# Altium footprint library SMD_Bauteile.PcbLib: 355 footprints (part 20 of 23)
Each footprint in its own frame and in the unit in brackets; x right, y up, seen from the top. Pads: shape width x height; smd on the part's side, far side on the other; paste and mask are expansions set on the pad; w line width, h text height; cw(c..) or ccw(c..) is an arc to the next point about the centre after c.
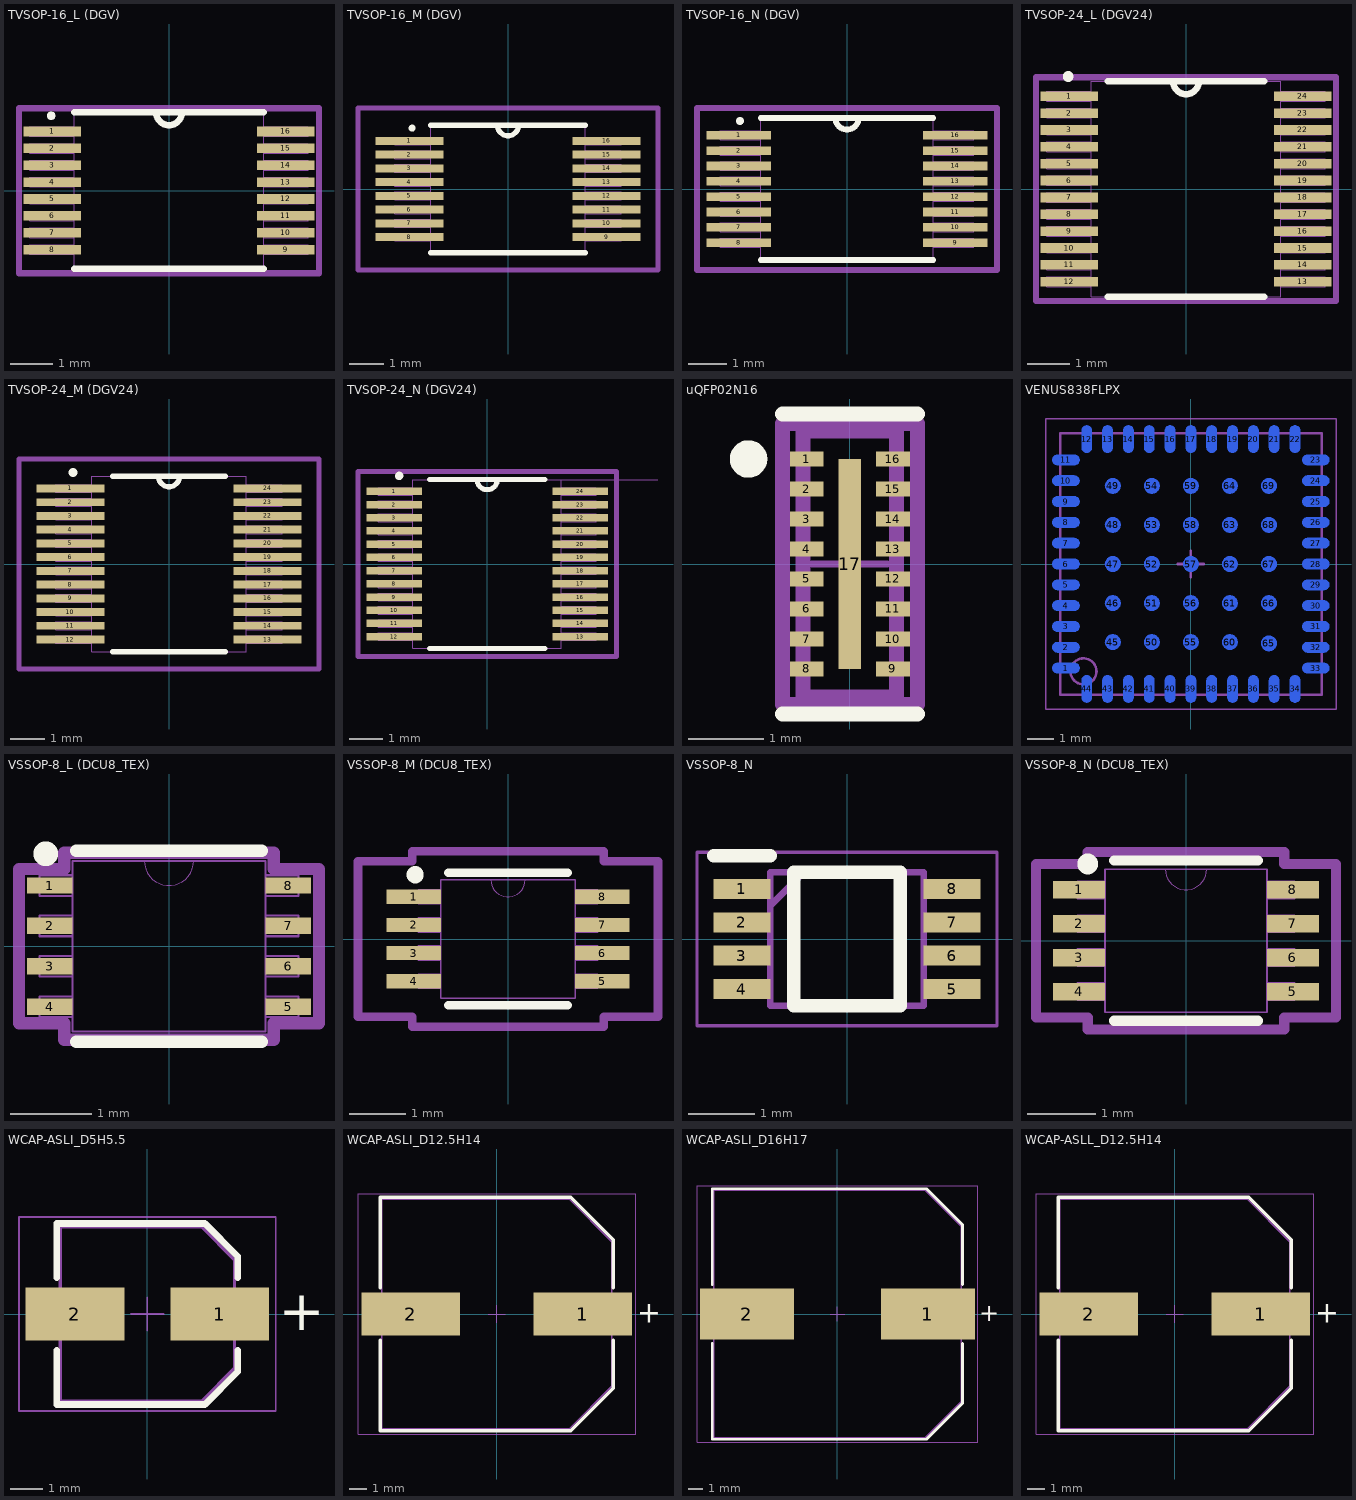
[diagram p19: the footprints below, top view; thin cyan lines are the x and y axes]

## TVSOP-16_L (DGV) [mil]
height 47.24
pads (16):
  rect 54x9 smd: 1(-109,55.12) 2(-109,39.37) 3(-109,23.62) 4(-109,7.87) 5(-109,-7.87) 6(-109,-23.62) 7(-109,-39.37) 8(-109,-55.12) 9(109,-55.12) 10(109,-39.37) 11(109,-23.62) 12(109,-7.87) 13(109,7.87) 14(109,23.62) 15(109,39.37) 16(109,55.12)
Top Overlay:
  circle w7.87: c-110,69.83 r0.1
  lines w6: -88.5,-73 88.5,-73 ; -88.5,73 88.5,73 ; -12,73 ccw(c0,73) 12,73
Mech Misc 1:
  lines w0: -12,73 ccw(c0,73) 12,73
  lines w1: -130,-59.62 -130,-50.62 -88.5,-50.62 -88.5,-59.62 -130,-59.62 ; -130,-43.87 -130,-34.87 -88.5,-34.87 -88.5,-43.87 -130,-43.87 ; -130,-28.12 -130,-19.12 -88.5,-19.12 -88.5,-28.12 -130,-28.12 ; -130,-12.37 -130,-3.37 -88.5,-3.37 -88.5,-12.37 -130,-12.37 ; -130,3.37 -130,12.37 -88.5,12.37 -88.5,3.37 -130,3.37 ; -130,19.12 -130,28.12 -88.5,28.12 -88.5,19.12 -130,19.12 ; -130,34.87 -130,43.87 -88.5,43.87 -88.5,34.87 -130,34.87 ; -130,50.62 -130,59.62 -88.5,59.62 -88.5,50.62 -130,50.62 ; -88.5,-73 88.5,-73 88.5,73 -88.5,73 -88.5,-73 ; 88.5,-59.62 88.5,-50.62 130,-50.62 130,-59.62 88.5,-59.62 ; 88.5,-43.87 88.5,-34.87 130,-34.87 130,-43.87 88.5,-43.87 ; 88.5,-28.12 88.5,-19.12 130,-19.12 130,-28.12 88.5,-28.12 ; 88.5,-12.37 88.5,-3.37 130,-3.37 130,-12.37 88.5,-12.37 ; 88.5,3.37 88.5,12.37 130,12.37 130,3.37 88.5,3.37 ; 88.5,19.12 88.5,28.12 130,28.12 130,19.12 88.5,19.12 ; 88.5,34.87 88.5,43.87 130,43.87 130,34.87 88.5,34.87 ; 88.5,50.62 88.5,59.62 130,59.62 130,50.62 88.5,50.62
Mech 15:
  lines w6: -140,-77 -140,77 140,77 140,-77 -140,-77
3D body: height 10, standoff 0, extent 0,0 10,10
3D body "TVSOP-16 (DGV).stp": height 44.49, standoff 0, extent -125.98,-70.86 125.99,70.87

## TVSOP-16_M (DGV) [mil]
height 47.24
pads (16):
  rect 78x9 smd: 1(-113,55.12) 2(-113,39.37) 3(-113,23.62) 4(-113,7.87) 5(-113,-7.87) 6(-113,-23.62) 7(-113,-39.37) 8(-113,-55.12) 9(113,-55.12) 10(113,-39.37) 11(113,-23.62) 12(113,-7.87) 13(113,7.87) 14(113,23.62) 15(113,39.37) 16(113,55.12)
Top Overlay:
  circle w7.87: c-110,69.83 r0.1
  lines w6: -88.5,-73 88.5,-73 ; -88.5,73 88.5,73 ; -12,73 ccw(c0,73) 12,73
Mech Misc 1:
  lines w0: -12,73 ccw(c0,73) 12,73
  lines w1: -130,-59.62 -88.5,-59.62 -88.5,-50.62 -130,-50.62 -130,-59.62 ; -130,-43.87 -88.5,-43.87 -88.5,-34.87 -130,-34.87 -130,-43.87 ; -130,-28.12 -88.5,-28.12 -88.5,-19.12 -130,-19.12 -130,-28.12 ; -130,-12.37 -88.5,-12.37 -88.5,-3.37 -130,-3.37 -130,-12.37 ; -130,3.37 -88.5,3.37 -88.5,12.37 -130,12.37 -130,3.37 ; -130,19.12 -88.5,19.12 -88.5,28.12 -130,28.12 -130,19.12 ; -130,34.87 -88.5,34.87 -88.5,43.87 -130,43.87 -130,34.87 ; -130,50.62 -88.5,50.62 -88.5,59.62 -130,59.62 -130,50.62 ; -88.5,-73 -88.5,73 88.5,73 88.5,-73 -88.5,-73 ; 88.5,-59.62 130,-59.62 130,-50.62 88.5,-50.62 88.5,-59.62 ; 88.5,-43.87 130,-43.87 130,-34.87 88.5,-34.87 88.5,-43.87 ; 88.5,-28.12 130,-28.12 130,-19.12 88.5,-19.12 88.5,-28.12 ; 88.5,-12.37 130,-12.37 130,-3.37 88.5,-3.37 88.5,-12.37 ; 88.5,3.37 130,3.37 130,12.37 88.5,12.37 88.5,3.37 ; 88.5,19.12 130,19.12 130,28.12 88.5,28.12 88.5,19.12 ; 88.5,34.87 130,34.87 130,43.87 88.5,43.87 88.5,34.87 ; 88.5,50.62 130,50.62 130,59.62 88.5,59.62 88.5,50.62
Mech 15:
  lines w6: -172,-93 172,-93 172,93 -172,93 -172,-93
3D body: height 10, standoff 0, extent 0,0 10,10
3D body "TVSOP-16 (DGV).stp": height 44.49, standoff 0, extent -125.98,-70.86 125.99,70.87

## TVSOP-16_N (DGV) [mil]
height 47.24
pads (16):
  rect 66x9 smd: 1(-111,55.12) 2(-111,39.37) 3(-111,23.62) 4(-111,7.87) 5(-111,-7.87) 6(-111,-23.62) 7(-111,-39.37) 8(-111,-55.12) 9(111,-55.12) 10(111,-39.37) 11(111,-23.62) 12(111,-7.87) 13(111,7.87) 14(111,23.62) 15(111,39.37) 16(111,55.12)
Top Overlay:
  circle w7.87: c-110,69.83 r0.1
  lines w6: -88.5,-73 88.5,-73 ; -88.5,73 88.5,73 ; -12,73 ccw(c0,73) 12,73
Mech Misc 1:
  lines w0: -12,73 ccw(c0,73) 12,73
  lines w1: -130,-59.62 -88.5,-59.62 -88.5,-50.62 -130,-50.62 -130,-59.62 ; -130,-43.87 -88.5,-43.87 -88.5,-34.87 -130,-34.87 -130,-43.87 ; -130,-28.12 -88.5,-28.12 -88.5,-19.12 -130,-19.12 -130,-28.12 ; -130,-12.37 -88.5,-12.37 -88.5,-3.37 -130,-3.37 -130,-12.37 ; -130,3.37 -88.5,3.37 -88.5,12.37 -130,12.37 -130,3.37 ; -130,19.12 -88.5,19.12 -88.5,28.12 -130,28.12 -130,19.12 ; -130,34.87 -88.5,34.87 -88.5,43.87 -130,43.87 -130,34.87 ; -130,50.62 -88.5,50.62 -88.5,59.62 -130,59.62 -130,50.62 ; -88.5,-73 -88.5,73 88.5,73 88.5,-73 -88.5,-73 ; 88.5,-59.62 130,-59.62 130,-50.62 88.5,-50.62 88.5,-59.62 ; 88.5,-43.87 130,-43.87 130,-34.87 88.5,-34.87 88.5,-43.87 ; 88.5,-28.12 130,-28.12 130,-19.12 88.5,-19.12 88.5,-28.12 ; 88.5,-12.37 130,-12.37 130,-3.37 88.5,-3.37 88.5,-12.37 ; 88.5,3.37 130,3.37 130,12.37 88.5,12.37 88.5,3.37 ; 88.5,19.12 130,19.12 130,28.12 88.5,28.12 88.5,19.12 ; 88.5,34.87 130,34.87 130,43.87 88.5,43.87 88.5,34.87 ; 88.5,50.62 130,50.62 130,59.62 88.5,59.62 88.5,50.62
Mech 15:
  lines w6: -154,-83 154,-83 154,83 -154,83 -154,-83
3D body "TVSOP-16 (DGV).stp": height 44.49, standoff 0, extent -125.98,-70.86 125.99,70.87

## TVSOP-24_L (DGV24) [mil]
height 47.24
pads (24):
  rect 54x9 smd: 1(-109,86.61) 2(-109,70.87) 3(-109,55.12) 4(-109,39.37) 5(-109,23.62) 6(-109,7.87) 7(-109,-7.87) 8(-109,-23.62) 9(-109,-39.37) 10(-109,-55.12) 11(-109,-70.87) 12(-109,-86.61) 13(109,-86.61) 14(109,-70.87) 15(109,-55.12) 16(109,-39.37) 17(109,-23.62) 18(109,-7.87) 19(109,7.87) 20(109,23.62) 21(109,39.37) 22(109,55.12) 23(109,70.87) 24(109,86.61)
Top Overlay:
  circle w10: c-110,105 r0.01
  lines w6: -72.86,-100.5 72.86,-100.5 ; -72.86,100.5 72.86,100.5 ; -12,100.5 ccw(c0,100.5) 12,100.5
Mech Misc 1:
  lines w0: -12,100.5 ccw(c0,100.5) 12,100.5
  lines w1: -130,-91.11 -88.5,-91.11 -88.5,-82.11 -130,-82.11 -130,-91.11 ; -130,-75.37 -88.5,-75.37 -88.5,-66.37 -130,-66.37 -130,-75.37 ; -130,-59.62 -88.5,-59.62 -88.5,-50.62 -130,-50.62 -130,-59.62 ; -130,-43.87 -88.5,-43.87 -88.5,-34.87 -130,-34.87 -130,-43.87 ; -130,-28.12 -88.5,-28.12 -88.5,-19.12 -130,-19.12 -130,-28.12 ; -130,-12.37 -88.5,-12.37 -88.5,-3.37 -130,-3.37 -130,-12.37 ; -130,3.37 -88.5,3.37 -88.5,12.37 -130,12.37 -130,3.37 ; -130,19.12 -88.5,19.12 -88.5,28.12 -130,28.12 -130,19.12 ; -130,34.87 -88.5,34.87 -88.5,43.87 -130,43.87 -130,34.87 ; -130,50.62 -88.5,50.62 -88.5,59.62 -130,59.62 -130,50.62 ; -130,66.37 -88.5,66.37 -88.5,75.37 -130,75.37 -130,66.37 ; -130,82.11 -88.5,82.11 -88.5,91.11 -130,91.11 -130,82.11 ; -88.5,-100.5 -88.5,100.5 88.5,100.5 88.5,-100.5 -88.5,-100.5 ; 88.5,-91.11 130,-91.11 130,-82.11 88.5,-82.11 88.5,-91.11 ; 88.5,-75.37 130,-75.37 130,-66.37 88.5,-66.37 88.5,-75.37 ; 88.5,-59.62 130,-59.62 130,-50.62 88.5,-50.62 88.5,-59.62 ; 88.5,-43.87 130,-43.87 130,-34.87 88.5,-34.87 88.5,-43.87 ; 88.5,-28.12 130,-28.12 130,-19.12 88.5,-19.12 88.5,-28.12 ; 88.5,-12.37 130,-12.37 130,-3.37 88.5,-3.37 88.5,-12.37 ; 88.5,3.37 130,3.37 130,12.37 88.5,12.37 88.5,3.37 ; 88.5,19.12 130,19.12 130,28.12 88.5,28.12 88.5,19.12 ; 88.5,34.87 130,34.87 130,43.87 88.5,43.87 88.5,34.87 ; 88.5,50.62 130,50.62 130,59.62 88.5,59.62 88.5,50.62 ; 88.5,66.37 130,66.37 130,75.37 88.5,75.37 88.5,66.37 ; 88.5,82.11 130,82.11 130,91.11 88.5,91.11 88.5,82.11
Mech 15:
  lines w6: -140,-104.5 140,-104.5 140,104.5 -140,104.5 -140,-104.5
3D body "TVSOP-24-DGV.stp": height 44.49, standoff 0, extent -125.98,-98.42 125.99,98.44
3D body: height 10, standoff 0, extent 0,0 10,10

## TVSOP-24_M (DGV24) [mil]
height 47.24
pads (24):
  rect 78x9 smd: 1(-113,86.61) 2(-113,70.87) 3(-113,55.12) 4(-113,39.37) 5(-113,23.62) 6(-113,7.87) 7(-113,-7.87) 8(-113,-23.62) 9(-113,-39.37) 10(-113,-55.12) 11(-113,-70.87) 12(-113,-86.61) 13(113,-86.61) 14(113,-70.87) 15(113,-55.12) 16(113,-39.37) 17(113,-23.62) 18(113,-7.87) 19(113,7.87) 20(113,23.62) 21(113,39.37) 22(113,55.12) 23(113,70.87) 24(113,86.61)
Top Overlay:
  circle w10: c-110,105 r0.01
  lines w6: -64.86,-100.5 64.86,-100.5 ; -64.86,100.5 64.86,100.5 ; -12,100.5 ccw(c0,100.5) 12,100.5
Mech Misc 1:
  lines w0: -12,100.5 ccw(c0,100.5) 12,100.5
  lines w1: -130,-91.11 -88.5,-91.11 -88.5,-82.11 -130,-82.11 -130,-91.11 ; -130,-75.37 -88.5,-75.37 -88.5,-66.37 -130,-66.37 -130,-75.37 ; -130,-59.62 -88.5,-59.62 -88.5,-50.62 -130,-50.62 -130,-59.62 ; -130,-43.87 -88.5,-43.87 -88.5,-34.87 -130,-34.87 -130,-43.87 ; -130,-28.12 -88.5,-28.12 -88.5,-19.12 -130,-19.12 -130,-28.12 ; -130,-12.37 -88.5,-12.37 -88.5,-3.37 -130,-3.37 -130,-12.37 ; -130,3.37 -88.5,3.37 -88.5,12.37 -130,12.37 -130,3.37 ; -130,19.12 -88.5,19.12 -88.5,28.12 -130,28.12 -130,19.12 ; -130,34.87 -88.5,34.87 -88.5,43.87 -130,43.87 -130,34.87 ; -130,50.62 -88.5,50.62 -88.5,59.62 -130,59.62 -130,50.62 ; -130,66.37 -88.5,66.37 -88.5,75.37 -130,75.37 -130,66.37 ; -130,82.11 -88.5,82.11 -88.5,91.11 -130,91.11 -130,82.11 ; -88.5,-100.5 -88.5,100.5 88.5,100.5 88.5,-100.5 -88.5,-100.5 ; 88.5,-91.11 130,-91.11 130,-82.11 88.5,-82.11 88.5,-91.11 ; 88.5,-75.37 130,-75.37 130,-66.37 88.5,-66.37 88.5,-75.37 ; 88.5,-59.62 130,-59.62 130,-50.62 88.5,-50.62 88.5,-59.62 ; 88.5,-43.87 130,-43.87 130,-34.87 88.5,-34.87 88.5,-43.87 ; 88.5,-28.12 130,-28.12 130,-19.12 88.5,-19.12 88.5,-28.12 ; 88.5,-12.37 130,-12.37 130,-3.37 88.5,-3.37 88.5,-12.37 ; 88.5,3.37 130,3.37 130,12.37 88.5,12.37 88.5,3.37 ; 88.5,19.12 130,19.12 130,28.12 88.5,28.12 88.5,19.12 ; 88.5,34.87 130,34.87 130,43.87 88.5,43.87 88.5,34.87 ; 88.5,50.62 130,50.62 130,59.62 88.5,59.62 88.5,50.62 ; 88.5,66.37 130,66.37 130,75.37 88.5,75.37 88.5,66.37 ; 88.5,82.11 130,82.11 130,91.11 88.5,91.11 88.5,82.11
Mech 15:
  lines w6: -172,-120.5 172,-120.5 172,120.5 -172,120.5 -172,-120.5
3D body: height 10, standoff 0, extent 0,0 10,10
3D body "TVSOP-24-DGV.stp": height 44.49, standoff 0, extent -125.98,-98.42 125.99,98.43

## TVSOP-24_N (DGV24) [mil]
height 47.24
pads (24):
  rect 66x9 smd: 1(-111,86.61) 2(-111,70.87) 3(-111,55.12) 4(-111,39.37) 5(-111,23.62) 6(-111,7.87) 7(-111,-7.87) 8(-111,-23.62) 9(-111,-39.37) 10(-111,-55.12) 11(-111,-70.87) 12(-111,-86.61) 13(111,-86.61) 14(111,-70.87) 15(111,-55.12) 16(111,-39.37) 17(111,-23.62) 18(111,-7.87) 19(111,7.87) 20(111,23.62) 21(111,39.37) 22(111,55.12) 23(111,70.87) 24(111,86.61)
Top Overlay:
  circle w10: c-105,105 r0.01
  lines w6: -68.86,-100.5 68.86,-100.5 ; -68.86,100.5 68.86,100.5 ; -12,100.5 ccw(c0,100.5) 12,100.5
Top Courtyard:
  lines w1: 0,100.5 203.5,100.5
Mech Misc 1:
  lines w0: -12,100.5 ccw(c0,100.5) 12,100.5
  lines w1: -130,-91.11 -130,-82.11 -88.5,-82.11 -88.5,-91.11 -130,-91.11 ; -130,-75.37 -130,-66.37 -88.5,-66.37 -88.5,-75.37 -130,-75.37 ; -130,-59.62 -130,-50.62 -88.5,-50.62 -88.5,-59.62 -130,-59.62 ; -130,-43.87 -130,-34.87 -88.5,-34.87 -88.5,-43.87 -130,-43.87 ; -130,-28.12 -130,-19.12 -88.5,-19.12 -88.5,-28.12 -130,-28.12 ; -130,-12.37 -130,-3.37 -88.5,-3.37 -88.5,-12.37 -130,-12.37 ; -130,3.37 -130,12.37 -88.5,12.37 -88.5,3.37 -130,3.37 ; -130,19.12 -130,28.12 -88.5,28.12 -88.5,19.12 -130,19.12 ; -130,34.87 -130,43.87 -88.5,43.87 -88.5,34.87 -130,34.87 ; -130,50.62 -130,59.62 -88.5,59.62 -88.5,50.62 -130,50.62 ; -130,66.37 -130,75.37 -88.5,75.37 -88.5,66.37 -130,66.37 ; -130,82.11 -130,91.11 -88.5,91.11 -88.5,82.11 -130,82.11 ; -88.5,-100.5 88.5,-100.5 88.5,100.5 -88.5,100.5 -88.5,-100.5 ; 88.5,-91.11 88.5,-82.11 130,-82.11 130,-91.11 88.5,-91.11 ; 88.5,-75.37 88.5,-66.37 130,-66.37 130,-75.37 88.5,-75.37 ; 88.5,-59.62 88.5,-50.62 130,-50.62 130,-59.62 88.5,-59.62 ; 88.5,-43.87 88.5,-34.87 130,-34.87 130,-43.87 88.5,-43.87 ; 88.5,-28.12 88.5,-19.12 130,-19.12 130,-28.12 88.5,-28.12 ; 88.5,-12.37 88.5,-3.37 130,-3.37 130,-12.37 88.5,-12.37 ; 88.5,3.37 88.5,12.37 130,12.37 130,3.37 88.5,3.37 ; 88.5,19.12 88.5,28.12 130,28.12 130,19.12 88.5,19.12 ; 88.5,34.87 88.5,43.87 130,43.87 130,34.87 88.5,34.87 ; 88.5,50.62 88.5,59.62 130,59.62 130,50.62 88.5,50.62 ; 88.5,66.37 88.5,75.37 130,75.37 130,66.37 88.5,66.37 ; 88.5,82.11 88.5,91.11 130,91.11 130,82.11 88.5,82.11
Mech 15:
  lines w6: -154,-110.5 -154,110.5 154,110.5 154,-110.5 -154,-110.5
3D body: height 10, standoff 0, extent 0,0 10,10
3D body "TVSOP-24-DGV.stp": height 44.49, standoff 0, extent -125.98,-98.42 125.99,98.43

## uQFP02N16 [mm]
pads (17):
  rect 0.45x0.2 smd paste-1000 mask+0: 1(-0.575,1.4) 2(-0.575,1) 3(-0.575,0.6) 4(-0.575,0.2) 5(-0.575,-0.2) 6(-0.575,-0.6) 7(-0.575,-1) 8(-0.575,-1.4) 9(0.575,-1.4) 10(0.575,-1) 11(0.575,-0.6) 12(0.575,-0.2) 13(0.575,0.2) 14(0.575,0.6) 15(0.575,1) 16(0.575,1.4)
  rect 0.3x2.8 smd paste-1000 mask+0: 17(0,0)
Top Overlay:
  circle w0.25: c-1.35,1.4 r0.125
  lines w0.2: -0.9,-2 0.9,-2 ; -0.9,2 0.9,2
Top Paste:
  rectangle: 0.365,1.305 0.785,1.495
  rectangle: 0.365,0.905 0.785,1.095
  rectangle: 0.365,0.505 0.785,0.695
  rectangle: 0.365,0.105 0.785,0.295
  rectangle: 0.365,-0.295 0.785,-0.105
  rectangle: 0.365,-0.695 0.785,-0.505
  rectangle: 0.365,-1.095 0.785,-0.905
  rectangle: 0.365,-1.495 0.785,-1.305
  rectangle: -0.785,-1.495 -0.365,-1.305
  rectangle: -0.785,-1.095 -0.365,-0.905
  rectangle: -0.785,-0.695 -0.365,-0.505
  rectangle: -0.785,-0.295 -0.365,-0.105
  rectangle: -0.785,0.105 -0.365,0.295
  rectangle: -0.785,0.505 -0.365,0.695
  rectangle: -0.785,0.905 -0.365,1.095
  rectangle: -0.785,1.305 -0.365,1.495
  rectangle: -0.1,-1.05 0.1,1.05
Mech 5:
  lines w0.2: -0.9,-1.875 -0.9,1.875 0.9,1.875 0.9,-1.875 -0.9,-1.875
  text ".Designator" at 0,0.187 h1
Mech Misc 1:
  lines w0.2: -0.625,-1.775 -0.625,1.775 0.625,1.775 0.625,-1.775 -0.625,-1.775
Mech 15:
  lines w0.2: -0.9,-1.875 -0.9,1.875 0.9,1.875 0.9,-1.875 -0.9,-1.875
Mechanical 16:
  lines w0.1: -0.5,0 0.5,0 ; 0,-0.5 0,0.5
3D body "Filter_STMicroelectronics_EMIF06-MSD02N16_eec.STEP": height 0.25, standoff 0, extent -0.9,-1.875 0.9,1.875

## VENUS838FLPX [mm] "QFN, 44-Leads, Body 10,00x10,00mm, Pitch 0,80mm, IPC Medium Density"
height 1.29
pads (69):
  oval 1.05x0.4 smd far side: 1(-4.8,-4) 2(-4.8,-3.2) 3(-4.8,-2.4) 4(-4.8,-1.6) 5(-4.8,-0.8) 6(-4.8,0) 7(-4.8,0.8) 8(-4.8,1.6) 9(-4.8,2.4) 10(-4.8,3.2) 11(-4.8,4) 23(4.8,4) 24(4.8,3.2) 25(4.8,2.4) 26(4.8,1.6) 27(4.8,0.8) 28(4.8,0) 29(4.8,-0.8) 30(4.8,-1.6) 31(4.8,-2.4) 32(4.8,-3.2) 33(4.8,-4)
  oval 0.4x1.05 smd far side: 12(-4,4.8) 13(-3.2,4.8) 14(-2.4,4.8) 15(-1.6,4.8) 16(-0.8,4.8) 17(0,4.8) 18(0.8,4.8) 19(1.6,4.8) 20(2.4,4.8) 21(3.2,4.8) 22(4,4.8) 34(4,-4.8) 35(3.2,-4.8) 36(2.4,-4.8) 37(1.6,-4.8) 38(0.8,-4.8) 39(0,-4.8) 40(-0.8,-4.8) 41(-1.6,-4.8) 42(-2.4,-4.8) 43(-3.2,-4.8) 44(-4,-4.8)
  round 0.6 smd far side: 45(-3,-3) 46(-3,-1.5) 47(-3,0) 48(-3,1.5) 49(-3,3) 50(-1.5,-3) 51(-1.5,-1.5) 52(-1.5,0) 53(-1.5,1.5) 54(-1.5,3) 55(0,-3) 56(0,-1.5) 57(0,0) 58(0,1.5) 59(0,3) 60(1.5,-3) 61(1.5,-1.5) 62(1.5,0) 63(1.5,1.5) 64(1.5,3) 65(3,-3.048) 66(3,-1.5) 67(3,0) 68(3,1.5) 69(3,3)
Bottom Overlay:
  circle w0.25: c-5.825,-5.025 r0.125
  lines w0.2: -5.175,-4.6 -5.175,-5.175 -4.6,-5.175 ; -5.175,4.6 -5.175,5.175 -4.6,5.175 ; 4.6,-5.175 5.175,-5.175 5.175,-4.6 ; 4.6,5.175 5.175,5.175 5.175,4.6
Mech Misc 1:
  circle w0.1: c-4.125,-4.125 r0.5
  lines w0.1: -5.025,-5.025 5.025,-5.025 5.025,5.025 -5.025,5.025 -5.025,-5.025
Mech 15:
  lines w0.05: -5.575,-5.575 5.575,-5.575 5.575,5.575 -5.575,5.575 -5.575,-5.575
  lines w0.1: -0.5,0 0.5,0 ; 0,-0.5 0,0.5
3D body "QFN80P1000X1000X129-44N.step": height 1.29, standoff 0, extent -5.035,-5.035 5.035,5.035

## VSSOP-8_L (DCU8_TEX) [mil]
height 35.43
pads (8):
  rect 22x8 smd paste+0 mask+0: 1(-58,29.53) 2(-58,9.84) 3(-58,-9.84) 4(-58,-29.53) 5(58,-29.53) 6(58,-9.84) 7(58,9.84) 8(58,29.53)
Top Overlay:
  circle w10: c-60,45 r1
  lines w6: -45.18,-46.5 45.18,-46.5 ; -45.18,46.5 45.18,46.5
Mech Misc 1:
  lines w0: -12,41.5 ccw(c0,41.5) 12,41.5
  lines w1: -63,-34.53 -47,-34.53 -47,-24.53 -63,-24.53 -63,-34.53 ; -63,-14.84 -47,-14.84 -47,-4.84 -63,-4.84 -63,-14.84 ; -63,4.84 -47,4.84 -47,14.84 -63,14.84 -63,4.84 ; -63,24.53 -47,24.53 -47,34.53 -63,34.53 -63,24.53 ; -47,-41.5 -47,41.5 47,41.5 47,-41.5 -47,-41.5 ; 47,-34.53 63,-34.53 63,-24.53 47,-24.53 47,-34.53 ; 47,-14.84 63,-14.84 63,-4.84 47,-4.84 47,-14.84 ; 47,4.84 63,4.84 63,14.84 47,14.84 47,4.84 ; 47,24.53 63,24.53 63,34.53 47,34.53 47,24.53
Mech 15:
  lines w6: -73,-37.53 -51,-37.53 -51,-45.5 51,-45.5 51,-37.53 73,-37.53 73,37.53 51,37.53 51,45.5 -51,45.5 -51,37.53 -73,37.53 -73,-37.53
3D body: height 10, standoff 0, extent 0,0 10,10
3D body "DCU8_TEX.step": height 35.12, standoff 0, extent -62.99,-41.49 62.99,41.5

## VSSOP-8_M (DCU8_TEX) [mil]
height 35.43
pads (8):
  rect 38x10 smd paste+0 mask+0: 1(-66,29.53) 2(-66,9.84) 3(-66,-9.84) 4(-66,-29.53) 5(66,-29.53) 6(66,-9.84) 7(66,9.84) 8(66,29.53)
Top Overlay:
  circle w10: c-65,45 r1
  lines w6: -41.68,-46.5 41.68,-46.5 ; -41.68,46.5 41.68,46.5
Mech Misc 1:
  lines w0: -12,41.5 ccw(c0,41.5) 12,41.5
  lines w1: -63,-34.53 -47,-34.53 -47,-24.53 -63,-24.53 -63,-34.53 ; -63,-14.84 -47,-14.84 -47,-4.84 -63,-4.84 -63,-14.84 ; -63,4.84 -47,4.84 -47,14.84 -63,14.84 -63,4.84 ; -63,24.53 -47,24.53 -47,34.53 -63,34.53 -63,24.53 ; -47,-41.5 -47,41.5 47,41.5 47,-41.5 -47,-41.5 ; 47,-34.53 63,-34.53 63,-24.53 47,-24.53 47,-34.53 ; 47,-14.84 63,-14.84 63,-4.84 47,-4.84 47,-14.84 ; 47,4.84 63,4.84 63,14.84 47,14.84 47,4.84 ; 47,24.53 63,24.53 63,34.53 47,34.53 47,24.53
Mech 15:
  lines w6: -105,-54.53 -67,-54.53 -67,-61.5 67,-61.5 67,-54.53 105,-54.53 105,54.53 67,54.53 67,61.5 -67,61.5 -67,54.53 -105,54.53 -105,-54.53
3D body: height 10, standoff 0, extent 0,0 10,10
3D body "DCU8_TEX.step": height 35.12, standoff 0, extent -62.99,-41.49 62.99,41.5

## VSSOP-8_N [mm]
pads (8):
  rect 0.85x0.3 smd: 1(-1.575,0.75) 2(-1.575,0.25) 3(-1.575,-0.25) 4(-1.575,-0.75) 5(1.575,-0.75) 6(1.575,-0.25) 7(1.575,0.25) 8(1.575,0.75)
Top Overlay:
  lines w0.2: -2,1.25 -1.15,1.25 ; -0.8,-1 0.8,-1 0.8,1 -0.8,1 -0.8,-1
Mech Misc 1:
  lines w0.1: -1.15,0.5 -0.65,1 ; -1.15,-1 1.15,-1 1.15,1 -1.15,1 -1.15,-1
Mech 15:
  lines w0.05: -2.25,-1.3 2.25,-1.3 2.25,1.3 -2.25,1.3 -2.25,-1.3
3D body "74HC3G14DC-Q100H.stp": height 1, standoff 0, extent -1.55,-1 1.55,1

## VSSOP-8_N (DCU8_TEX) [mil]
height 35.43
pads (8):
  rect 30x10 smd paste+0 mask+0: 1(-62,29.53) 2(-62,9.84) 3(-62,-9.84) 4(-62,-29.53) 5(62,-29.53) 6(62,-9.84) 7(62,9.84) 8(62,29.53)
Top Overlay:
  circle w10: c-57,44.53 r1
  lines w6: -41.68,-46.5 41.68,-46.5 ; -41.68,46.5 41.68,46.5
Mech Misc 1:
  lines w0: -12,41.5 ccw(c0,41.5) 12,41.5
  lines w1: -63,-34.53 -63,-24.53 -47,-24.53 -47,-34.53 -63,-34.53 ; -63,-14.84 -63,-4.84 -47,-4.84 -47,-14.84 -63,-14.84 ; -63,4.84 -63,14.84 -47,14.84 -47,4.84 -63,4.84 ; -63,24.53 -63,34.53 -47,34.53 -47,24.53 -63,24.53 ; -47,-41.5 47,-41.5 47,41.5 -47,41.5 -47,-41.5 ; 47,-34.53 47,-24.53 63,-24.53 63,-34.53 47,-34.53 ; 47,-14.84 47,-4.84 63,-4.84 63,-14.84 47,-14.84 ; 47,4.84 47,14.84 63,14.84 63,4.84 47,4.84 ; 47,24.53 47,34.53 63,34.53 63,24.53 47,24.53
Mech 15:
  lines w6: -87,-44.53 -87,44.53 -57,44.53 -57,51.5 57,51.5 57,44.53 87,44.53 87,-44.53 57,-44.53 57,-51.5 -57,-51.5 -57,-44.53 -87,-44.53
3D body: height 10, standoff 0, extent 0,0 10,10
3D body "DCU8_TEX.step": height 35.12, standoff 0, extent -62.99,-41.5 62.99,41.5

## WCAP-ASLI_D5H5.5 [mm] "Aluminium Electrolytic V-Chip SMT Capacitors, 5x5.5mm"
height 5.5
pads (2):
  rect 3x1.6 smd: 1(2.2,0) 2(-2.2,0)
Top Overlay:
  lines w0.2: -2.75,-1.1 -2.75,-2.75 1.75,-2.75 2.75,-1.75 2.75,-1.1 ; -2.75,1.1 -2.75,2.75 1.75,2.75 2.75,1.75 2.75,1.1
  text "+" at 4,-0.5 h1.22
Top 3D Body:
  lines w0.1: -2.65,-2.65 -2.65,2.65 1.65,2.65 2.65,1.65 2.65,-1.65 1.65,-2.65 -2.65,-2.65
Top Component Outline:
  lines w0.1: -2.65,-2.65 -2.65,2.65 1.65,2.65 2.65,1.65 2.65,-1.65 1.65,-2.65 -2.65,-2.65
Top Courtyard (Mech26):
  lines w0.05: -0.5,0 0.5,0 ; 0,-0.5 0,0.5 ; -3.9,-2.95 3.9,-2.95 3.9,2.95 -3.9,2.95 -3.9,-2.95
Top Designator:
  text ".Designator" at -7.498,-0.5 h1.5
3D body "5x5.5x1.4.stp": height 5.5, standoff 0, extent -3,-2.65 3,2.65

## WCAP-ASLI_D12.5H14 [mm] "Aluminium Electrolytic V-Chip SMT Capacitors, 12.5x14mm"
height 14
pads (2):
  rect 5.8x2.5 smd: 1(5.05,0) 2(-5.05,0)
Top Overlay:
  lines w0.2: -6.85,-1.55 -6.85,-6.85 4.35,-6.85 6.85,-4.35 6.85,-1.55 ; -6.85,1.55 -6.85,6.85 4.35,6.85 6.85,4.35 6.85,1.55
  text "+" at 8.25,-0.5 h1.22
Bottom Designator:
  lines w0.05: -0.5,0 0.5,0 ; 0,-0.5 0,0.5 ; -8.15,-7.05 8.15,-7.05 8.15,7.05 -8.15,7.05 -8.15,-7.05
Top Courtyard (Mech14):
  lines w0.1: -6.75,-6.75 -6.75,6.75 4.25,6.75 6.75,4.25 6.75,-4.25 4.25,-6.75 -6.75,-6.75
Mechanical 18:
  lines w0.1: -6.75,-6.75 -6.75,6.75 4.25,6.75 6.75,4.25 6.75,-4.25 4.25,-6.75 -6.75,-6.75
Top 3D Body:
  text ".Designator" at -7.498,-0.5 h1.5
3D body "12.5x14x4.5.stp": height 14, standoff 0, extent -7.1,-6.725 7.1,6.725

## WCAP-ASLI_D16H17 [mm] "Aluminium Electrolytic V-Chip SMT Capacitors, 16x17mm"
height 17
pads (2):
  rect 6.5x3.5 smd: 1(6.25,0) 2(-6.25,0)
Top Overlay:
  lines w0.2: -8.65,-2.05 -8.65,-8.65 6.15,-8.65 8.65,-6.15 8.65,-2.05 ; -8.65,2.05 -8.65,8.65 6.15,8.65 8.65,6.15 8.65,2.05
  text "+" at 9.8,-0.5 h1.22
Bottom Designator:
  lines w0.05: -0.5,0 0.5,0 ; 0,-0.5 0,0.5 ; -9.7,-8.85 9.7,-8.85 9.7,8.85 -9.7,8.85 -9.7,-8.85
Top Courtyard (Mech14):
  lines w0.1: -8.55,-8.55 -8.55,8.55 6.05,8.55 8.55,6.05 8.55,-6.05 6.05,-8.55 -8.55,-8.55
Mechanical 18:
  lines w0.1: -8.55,-8.55 -8.55,8.55 6.05,8.55 8.55,6.05 8.55,-6.05 6.05,-8.55 -8.55,-8.55
Top 3D Body:
  text ".Designator" at -7.498,-0.5 h1.5
3D body "16x17x7_new.stp": height 17, standoff 0, extent -9.15,-8.5 9.15,8.5

## WCAP-ASLL_D12.5H14 [mm] "Aluminium Electrolytic V-Chip SMT Capacitors, 12.5x14mm"
height 14
pads (2):
  rect 5.8x2.5 smd: 1(5.05,0) 2(-5.05,0)
Top Overlay:
  lines w0.2: -6.85,-1.55 -6.85,-6.85 4.35,-6.85 6.85,-4.35 6.85,-1.55 ; -6.85,1.55 -6.85,6.85 4.35,6.85 6.85,4.35 6.85,1.55
  text "+" at 8.25,-0.5 h1.22
Top Component Center:
  lines w0.05: -0.5,0 0.5,0 ; 0,-0.5 0,0.5
Top Component Outline:
  lines w0.1: -6.75,-6.75 4.25,-6.75 6.75,-4.25 6.75,4.25 4.25,6.75 -6.75,6.75 -6.75,-6.75
Top Courtyard (Mech26):
  lines w0.05: -8.15,-7.05 -8.15,7.05 8.15,7.05 8.15,-7.05 -8.15,-7.05
Top Designator:
  text ".Designator" at -7.498,-0.5 h1.5
3D body "12.5x14x4.5.stp": height 14, standoff 0, extent -7.1,-6.725 7.1,6.725